# Altium footprint library PcbLib_ICs.PcbLib: 317 footprints (part 13 of 24) (continued)
## QFN32 [mm] "QFN, 32-Leads, Body 5.00x5.00mm, Pitch 0.50mm, Thermal Pad 3.50x3.50mm, IPC Medium Density"
height 1.12
pads (33):
  rect 0.9x0.3 smd paste+0 mask+0.05: 1(-2.6,1.75)
  oval 0.9x0.3 smd paste+0 mask+0.05: 2(-2.6,1.25) 3(-2.6,0.75) 4(-2.6,0.25) 5(-2.6,-0.25) 6(-2.6,-0.75) 7(-2.6,-1.25) 8(-2.6,-1.75) 17(2.6,-1.75) 18(2.6,-1.25) 19(2.6,-0.75) 20(2.6,-0.25) 21(2.6,0.25) 22(2.6,0.75) 23(2.6,1.25) 24(2.6,1.75)
  oval 0.3x0.9 smd paste+0 mask+0.05: 9(-1.75,-2.6) 10(-1.25,-2.6) 11(-0.75,-2.6) 12(-0.25,-2.6) 13(0.25,-2.6) 14(0.75,-2.6) 15(1.25,-2.6) 16(1.75,-2.6) 25(1.75,2.6) 26(1.25,2.6) 27(0.75,2.6) 28(0.25,2.6) 29(-0.25,2.6) 30(-0.75,2.6) 31(-1.25,2.6) 32(-1.75,2.6)
  rrect10% 3.5x3.5 smd paste-3.5 mask+0.075: EP(0,0)
via 0,0 diameter 0.7 hole 0.3
via -0.6,0.6 diameter 0.7 hole 0.3
via 0.6,0.6 diameter 0.7 hole 0.3
via 0.8,1.4 diameter 0.7 hole 0.3
via 1.4,0.8 diameter 0.7 hole 0.3
via -0.7,1.4 diameter 0.7 hole 0.3
via -1.4,0.9 diameter 0.7 hole 0.3
via 1.4,-0.9 diameter 0.7 hole 0.3
via 0.7,-1.4 diameter 0.7 hole 0.3
via -1.4,-0.8 diameter 0.7 hole 0.3
via -0.8,-1.4 diameter 0.7 hole 0.3
via -0.6,-0.6 diameter 0.7 hole 0.3
via 0.6,-0.6 diameter 0.7 hole 0.3
Top Overlay:
  circle w0.25: c-3.5,2.5 r0.125
  lines w0.2: -2.715,-2.3 -2.715,-2.715 -2.3,-2.715 ; -2.715,2.3 -2.715,2.715 -2.3,2.715 ; 2.3,-2.715 2.715,-2.715 2.715,-2.3 ; 2.3,2.715 2.715,2.715 2.715,2.3
Top Paste:
  rectangle: 0.85,-1.55 1.55,-0.85
  rectangle: 0.05,-1.55 0.75,-0.85
  rectangle: -0.75,-1.55 -0.05,-0.85
  rectangle: -1.55,-1.55 -0.85,-0.85
  rectangle: -1.55,-0.75 -0.85,-0.05
  rectangle: -0.75,-0.75 -0.05,-0.05
  rectangle: 0.05,-0.75 0.75,-0.05
  rectangle: 0.85,-0.75 1.55,-0.05
  rectangle: -1.55,0.05 -0.85,0.75
  rectangle: -0.75,0.05 -0.05,0.75
  rectangle: 0.05,0.05 0.75,0.75
  rectangle: 0.85,0.05 1.55,0.75
  rectangle: -1.55,0.85 -0.85,1.55
  rectangle: -0.75,0.85 -0.05,1.55
  rectangle: 0.05,0.85 0.75,1.55
  rectangle: 0.85,0.85 1.55,1.55
Bottom Solder:
  region: -1.9,1.9 -0.5,1.9 0,1.4 0.5,1.9 1.9,1.9 1.9,0.5 1.4,0 1.9,-0.5 1.9,-1.9 0.5,-1.9 0,-1.4 -0.5,-1.9 -1.9,-1.9 -1.9,-0.5 -1.4,0 -1.9,0.5
Top Assy:
  circle w0.05: c-2,2 r0.2
  lines w0.05: -2.577,-1.9 -2.61,-1.9 -2.61,-1.6 -2.577,-1.6 ; -2.577,-1.4 -2.61,-1.4 -2.61,-1.1 -2.577,-1.1 ; -2.577,-0.9 -2.61,-0.9 -2.61,-0.6 -2.577,-0.6 ; -2.577,-0.4 -2.61,-0.4 -2.61,-0.1 -2.577,-0.1 ; -2.577,0.1 -2.61,0.1 -2.61,0.4 -2.577,0.4 ; -2.577,0.6 -2.61,0.6 -2.61,0.9 -2.577,0.9 ; -2.577,1.1 -2.61,1.1 -2.61,1.4 -2.577,1.4 ; -2.577,1.6 -2.61,1.6 -2.61,1.9 -2.577,1.9 ; -1.9,-2.577 -1.9,-2.61 -1.6,-2.61 -1.6,-2.577 ; -1.9,2.577 -1.9,2.61 -1.6,2.61 -1.6,2.577 ; -1.4,-2.577 -1.4,-2.61 -1.1,-2.61 -1.1,-2.577 ; -1.4,2.577 -1.4,2.61 -1.1,2.61 -1.1,2.577 ; -0.9,-2.577 -0.9,-2.61 -0.6,-2.61 -0.6,-2.577 ; -0.9,2.577 -0.9,2.61 -0.6,2.61 -0.6,2.577 ; -0.4,-2.577 -0.4,-2.61 -0.1,-2.61 -0.1,-2.577 ; -0.4,2.577 -0.4,2.61 -0.1,2.61 -0.1,2.577 ; 0.1,-2.577 0.1,-2.61 0.4,-2.61 0.4,-2.577 ; 0.1,2.577 0.1,2.61 0.4,2.61 0.4,2.577 ; 0.6,-2.577 0.6,-2.61 0.9,-2.61 0.9,-2.577 ; 0.6,2.577 0.6,2.61 0.9,2.61 0.9,2.577 ; 1.1,-2.577 1.1,-2.61 1.4,-2.61 1.4,-2.577 ; 1.1,2.577 1.1,2.61 1.4,2.61 1.4,2.577 ; 1.6,-2.577 1.6,-2.61 1.9,-2.61 1.9,-2.577 ; 1.6,2.577 1.6,2.61 1.9,2.61 1.9,2.577 ; 2.577,-1.9 2.61,-1.9 2.61,-1.6 2.577,-1.6 ; 2.577,-1.4 2.61,-1.4 2.61,-1.1 2.577,-1.1 ; 2.577,-0.9 2.61,-0.9 2.61,-0.6 2.577,-0.6 ; 2.577,-0.4 2.61,-0.4 2.61,-0.1 2.577,-0.1 ; 2.577,0.1 2.61,0.1 2.61,0.4 2.577,0.4 ; 2.577,0.6 2.61,0.6 2.61,0.9 2.577,0.9 ; 2.577,1.1 2.61,1.1 2.61,1.4 2.577,1.4 ; 2.577,1.6 2.61,1.6 2.61,1.9 2.577,1.9 ; -2.565,-2.565 -2.565,2.565 2.565,2.565 2.565,-2.565 -2.565,-2.565
  text ".Designator" at -3.443,-0.467 h2
Top Text:
  lines w0.05: -3.15,-3.15 3.15,-3.15 3.15,3.15 -3.15,3.15 -3.15,-3.15
  lines w0.1: -0.5,0 0.5,0 ; 0,-0.5 0,0.5
3D body "User Library-qfn32-5x5.STEP": height 0.8, standoff 0, extent -2.52,-2.51 2.5,2.51

## QFN32-0.4 [mm] "QFN, 32-Leads, Body 4,00x4,00mm, Pitch 0,40mm, Thermal Pad 2,80x2,80mm, IPC Medium Density"
height 1
pads (33):
  rect 0.55x0.2 smd paste+0 mask+0.05: 1(-1.925,1.4)
  rrect50% 0.55x0.2 smd paste+0 mask+0.05: 2(-1.925,1) 3(-1.925,0.6) 4(-1.925,0.2) 5(-1.925,-0.2) 6(-1.925,-0.6) 7(-1.925,-1) 8(-1.925,-1.4) 17(1.925,-1.4) 18(1.925,-1) 19(1.925,-0.6) 20(1.925,-0.2) 21(1.925,0.2) 22(1.925,0.6) 23(1.925,1) 24(1.925,1.4)
  rrect50% 0.2x0.55 smd paste+0 mask+0.05: 9(-1.4,-1.925) 10(-1,-1.925) 11(-0.6,-1.925) 12(-0.2,-1.925) 13(0.2,-1.925) 14(0.6,-1.925) 15(1,-1.925) 16(1.4,-1.925) 25(1.4,1.925) 26(1,1.925) 27(0.6,1.925) 28(0.2,1.925) 29(-0.2,1.925) 30(-0.6,1.925) 31(-1,1.925) 32(-1.4,1.925)
  rrect10% 2.8x2.8 smd paste-3 mask+0.05: EP(0,0)
via -0.5,-1.1 diameter 0.5 hole 0.2
via -1.1,-0.5 diameter 0.5 hole 0.2
via -0.5,-0.5 diameter 0.5 hole 0.2
via 0.5,-1.1 diameter 0.5 hole 0.2
via 1.1,-0.5 diameter 0.5 hole 0.2
via 0.5,-0.5 diameter 0.5 hole 0.2
via 0.5,1.1 diameter 0.5 hole 0.2
via 1.1,0.5 diameter 0.5 hole 0.2
via 0.5,0.5 diameter 0.5 hole 0.2
via -0.5,1.1 diameter 0.5 hole 0.2
via -1.1,0.5 diameter 0.5 hole 0.2
via 0,0 diameter 0.5 hole 0.2
via -0.5,0.5 diameter 0.5 hole 0.2
Top Overlay:
  circle w0.25: c-2.9,2.1 r0.125
  lines w0.2: -2.2,-1.785 -2.2,-2.2 -1.785,-2.2 ; -2.2,1.785 -2.2,2.2 -1.785,2.2 ; 1.785,-2.2 2.2,-2.2 2.2,-1.785 ; 1.785,2.2 2.2,2.2 2.2,1.785
Top Paste:
  rectangle: -0.55,-0.55 -0.05,-0.05
  region: 0.55,-0.55 0.55,-0.05 0.05,-0.05 0.05,-0.55
  region: 0.55,0.55 0.05,0.55 0.05,0.05 0.55,0.05
  region: -0.55,0.55 -0.55,0.05 -0.05,0.05 -0.05,0.55
  region: 1.15,1.15 0.65,1.15 0.65,0.65 1.15,0.65
  region: 1.15,0.55 0.65,0.55 0.65,0.05 1.15,0.05
  region: -0.55,1.15 -0.55,0.65 -0.05,0.65 -0.05,1.15
  region: 0.05,1.15 0.05,0.65 0.55,0.65 0.55,1.15
  region: 1.15,-0.55 1.15,-0.05 0.65,-0.05 0.65,-0.55
  region: 0.55,-1.15 0.55,-0.65 0.05,-0.65 0.05,-1.15
  region: 1.15,-1.15 1.15,-0.65 0.65,-0.65 0.65,-1.15
  region: -1.15,1.15 -1.15,0.65 -0.65,0.65 -0.65,1.15
  region: -1.15,0.55 -1.15,0.05 -0.65,0.05 -0.65,0.55
  rectangle: -1.15,-0.55 -0.65,-0.05
  rectangle: -1.15,-1.15 -0.65,-0.65
  region: -0.05,-1.15 -0.05,-0.65 -0.55,-0.65 -0.55,-1.15
Bottom Solder:
  region: -1.5,1.5 -0.3,1.5 0,1.2 0.3,1.5 1.5,1.5 1.5,0.3 1.2,0 1.5,-0.3 1.5,-1.5 0.3,-1.5 0,-1.2 -0.3,-1.5 -1.5,-1.5 -1.5,-0.3 -1.199,0.001 -1.5,0.301
Top Assy:
  circle w0.05: c-1.485,1.485 r0.2
  lines w0.05: -2.067,-1.55 -2.1,-1.55 -2.1,-1.25 -2.067,-1.25 ; -2.067,-1.15 -2.1,-1.15 -2.1,-0.85 -2.067,-0.85 ; -2.067,-0.75 -2.1,-0.75 -2.1,-0.45 -2.067,-0.45 ; -2.067,-0.35 -2.1,-0.35 -2.1,-0.05 -2.067,-0.05 ; -2.067,0.05 -2.1,0.05 -2.1,0.35 -2.067,0.35 ; -2.067,0.45 -2.1,0.45 -2.1,0.75 -2.067,0.75 ; -2.067,0.85 -2.1,0.85 -2.1,1.15 -2.067,1.15 ; -2.067,1.25 -2.1,1.25 -2.1,1.55 -2.067,1.55 ; -1.55,-2.067 -1.55,-2.1 -1.25,-2.1 -1.25,-2.067 ; -1.55,2.067 -1.55,2.1 -1.25,2.1 -1.25,2.067 ; -1.15,-2.067 -1.15,-2.1 -0.85,-2.1 -0.85,-2.067 ; -1.15,2.067 -1.15,2.1 -0.85,2.1 -0.85,2.067 ; -0.75,-2.067 -0.75,-2.1 -0.45,-2.1 -0.45,-2.067 ; -0.75,2.067 -0.75,2.1 -0.45,2.1 -0.45,2.067 ; -0.35,-2.067 -0.35,-2.1 -0.05,-2.1 -0.05,-2.067 ; -0.35,2.067 -0.35,2.1 -0.05,2.1 -0.05,2.067 ; 0.05,-2.067 0.05,-2.1 0.35,-2.1 0.35,-2.067 ; 0.05,2.067 0.05,2.1 0.35,2.1 0.35,2.067 ; 0.45,-2.067 0.45,-2.1 0.75,-2.1 0.75,-2.067 ; 0.45,2.067 0.45,2.1 0.75,2.1 0.75,2.067 ; 0.85,-2.067 0.85,-2.1 1.15,-2.1 1.15,-2.067 ; 0.85,2.067 0.85,2.1 1.15,2.1 1.15,2.067 ; 1.25,-2.067 1.25,-2.1 1.55,-2.1 1.55,-2.067 ; 1.25,2.067 1.25,2.1 1.55,2.1 1.55,2.067 ; 2.067,-1.55 2.1,-1.55 2.1,-1.25 2.067,-1.25 ; 2.067,-1.15 2.1,-1.15 2.1,-0.85 2.067,-0.85 ; 2.067,-0.75 2.1,-0.75 2.1,-0.45 2.067,-0.45 ; 2.067,-0.35 2.1,-0.35 2.1,-0.05 2.067,-0.05 ; 2.067,0.05 2.1,0.05 2.1,0.35 2.067,0.35 ; 2.067,0.45 2.1,0.45 2.1,0.75 2.067,0.75 ; 2.067,0.85 2.1,0.85 2.1,1.15 2.067,1.15 ; 2.067,1.25 2.1,1.25 2.1,1.55 2.067,1.55 ; -2.05,-2.05 -2.05,2.05 2.05,2.05 2.05,-2.05 -2.05,-2.05
  text ".Designator" at -3.443,-0.467 h2
Top Text:
  lines w0.05: -2.4,-2.4 -2.4,2.4 2.4,2.4 2.4,-2.4 -2.4,-2.4
  lines w0.1: -0.5,0 0.5,0 ; 0,-0.5 0,0.5
3D body "QFN32-0.4.STEP": height 1, standoff 0, extent -2.005,-2.005 2.005,2.005

## QFN32_IP2716 [mm] "QFN, 32-Leads, Body 5.00x5.00mm, Pitch 0.50mm, Thermal Pad 3.50x3.50mm, IPC Medium Density"
height 1.12
pads (33):
  rect 0.9x0.3 smd paste+0 mask+0.05: 1(-2.55,1.75)
  oval 0.9x0.3 smd paste+0 mask+0.05: 2(-2.55,1.25) 3(-2.55,0.75) 4(-2.55,0.25) 5(-2.55,-0.25) 6(-2.55,-0.75) 7(-2.55,-1.25) 8(-2.55,-1.75) 17(2.55,-1.75) 18(2.55,-1.25) 19(2.55,-0.75) 20(2.55,-0.25) 21(2.55,0.25) 22(2.55,0.75) 23(2.55,1.25) 24(2.55,1.75)
  oval 0.3x0.9 smd paste+0 mask+0.05: 9(-1.75,-2.55) 10(-1.25,-2.55) 11(-0.75,-2.55) 12(-0.25,-2.55) 13(0.25,-2.55) 14(0.75,-2.55) 15(1.25,-2.55) 16(1.75,-2.55) 25(1.75,2.55) 26(1.25,2.55) 27(0.75,2.55) 28(0.25,2.55) 29(-0.25,2.55) 30(-0.75,2.55) 31(-1.25,2.55) 32(-1.75,2.55)
  rrect10% 3.5x3.5 smd paste-3.5 mask+0.075: EP(0,0)
via 1.1,1.1 diameter 0.7 hole 0.3
via 1.1,0 diameter 0.7 hole 0.3
via 1.1,-1.1 diameter 0.7 hole 0.3
via 0,-1.1 diameter 0.7 hole 0.3
via -1.1,-1.1 diameter 0.7 hole 0.3
via -1.1,0 diameter 0.7 hole 0.3
via -1.1,1.1 diameter 0.7 hole 0.3
via 0,1.1 diameter 0.7 hole 0.3
via 0,0 diameter 0.7 hole 0.3
Top Overlay:
  circle w0.25: c-3.5,2.5 r0.125
  lines w0.2: -2.715,-2.3 -2.715,-2.715 -2.3,-2.715 ; -2.715,2.3 -2.715,2.715 -2.3,2.715 ; 2.3,-2.715 2.715,-2.715 2.715,-2.3 ; 2.3,2.715 2.715,2.715 2.715,2.3
Top Paste:
  rectangle: 0.85,0.85 1.55,1.55
  rectangle: 0.05,0.85 0.75,1.55
  rectangle: -0.75,0.85 -0.05,1.55
  rectangle: -1.55,0.85 -0.85,1.55
  rectangle: 0.85,0.05 1.55,0.75
  rectangle: 0.05,0.05 0.75,0.75
  rectangle: -0.75,0.05 -0.05,0.75
  rectangle: -1.55,0.05 -0.85,0.75
  rectangle: 0.85,-0.75 1.55,-0.05
  rectangle: 0.05,-0.75 0.75,-0.05
  rectangle: -0.75,-0.75 -0.05,-0.05
  rectangle: -1.55,-0.75 -0.85,-0.05
  rectangle: -1.55,-1.55 -0.85,-0.85
  rectangle: -0.75,-1.55 -0.05,-0.85
  rectangle: 0.05,-1.55 0.75,-0.85
  rectangle: 0.85,-1.55 1.55,-0.85
Bottom Solder:
  region: -1.9,1.9 -0.3,1.9 0,1.6 0.3,1.9 1.9,1.9 1.9,0.3 1.6,0 1.9,-0.3 1.9,-1.9 0.3,-1.9 0,-1.6 -0.3,-1.9 -1.9,-1.9 -1.9,-0.3 -1.6,0 -1.9,0.3
Top Assy:
  circle w0.05: c-2,2 r0.2
  lines w0.05: -2.577,-1.9 -2.61,-1.9 -2.61,-1.6 -2.577,-1.6 ; -2.577,-1.4 -2.61,-1.4 -2.61,-1.1 -2.577,-1.1 ; -2.577,-0.9 -2.61,-0.9 -2.61,-0.6 -2.577,-0.6 ; -2.577,-0.4 -2.61,-0.4 -2.61,-0.1 -2.577,-0.1 ; -2.577,0.1 -2.61,0.1 -2.61,0.4 -2.577,0.4 ; -2.577,0.6 -2.61,0.6 -2.61,0.9 -2.577,0.9 ; -2.577,1.1 -2.61,1.1 -2.61,1.4 -2.577,1.4 ; -2.577,1.6 -2.61,1.6 -2.61,1.9 -2.577,1.9 ; -1.9,-2.577 -1.9,-2.61 -1.6,-2.61 -1.6,-2.577 ; -1.9,2.577 -1.9,2.61 -1.6,2.61 -1.6,2.577 ; -1.4,-2.577 -1.4,-2.61 -1.1,-2.61 -1.1,-2.577 ; -1.4,2.577 -1.4,2.61 -1.1,2.61 -1.1,2.577 ; -0.9,-2.577 -0.9,-2.61 -0.6,-2.61 -0.6,-2.577 ; -0.9,2.577 -0.9,2.61 -0.6,2.61 -0.6,2.577 ; -0.4,-2.577 -0.4,-2.61 -0.1,-2.61 -0.1,-2.577 ; -0.4,2.577 -0.4,2.61 -0.1,2.61 -0.1,2.577 ; 0.1,-2.577 0.1,-2.61 0.4,-2.61 0.4,-2.577 ; 0.1,2.577 0.1,2.61 0.4,2.61 0.4,2.577 ; 0.6,-2.577 0.6,-2.61 0.9,-2.61 0.9,-2.577 ; 0.6,2.577 0.6,2.61 0.9,2.61 0.9,2.577 ; 1.1,-2.577 1.1,-2.61 1.4,-2.61 1.4,-2.577 ; 1.1,2.577 1.1,2.61 1.4,2.61 1.4,2.577 ; 1.6,-2.577 1.6,-2.61 1.9,-2.61 1.9,-2.577 ; 1.6,2.577 1.6,2.61 1.9,2.61 1.9,2.577 ; 2.577,-1.9 2.61,-1.9 2.61,-1.6 2.577,-1.6 ; 2.577,-1.4 2.61,-1.4 2.61,-1.1 2.577,-1.1 ; 2.577,-0.9 2.61,-0.9 2.61,-0.6 2.577,-0.6 ; 2.577,-0.4 2.61,-0.4 2.61,-0.1 2.577,-0.1 ; 2.577,0.1 2.61,0.1 2.61,0.4 2.577,0.4 ; 2.577,0.6 2.61,0.6 2.61,0.9 2.577,0.9 ; 2.577,1.1 2.61,1.1 2.61,1.4 2.577,1.4 ; 2.577,1.6 2.61,1.6 2.61,1.9 2.577,1.9 ; -2.565,-2.565 2.565,-2.565 2.565,2.565 -2.565,2.565 -2.565,-2.565
  text ".Designator" at -3.443,-0.467 h2
Top Text:
  lines w0.05: -3.15,-3.15 -3.15,3.15 3.15,3.15 3.15,-3.15 -3.15,-3.15
  lines w0.1: -0.5,0 0.5,0 ; 0,-0.5 0,0.5
3D body "QFN32_IP2716.STEP": height 0.85, standoff 0, extent -2.525,-2.525 2.525,2.525

## QFN32_SGTL5000 [mm]
pads (33):
  rect 0.75x0.25 smd paste+0 mask+0.08: 1(-2.375,1.75)
  oval 0.75x0.25 smd paste+0 mask+0.08: 2(-2.375,1.25) 3(-2.375,0.75) 4(-2.375,0.25) 5(-2.375,-0.25) 6(-2.375,-0.75) 7(-2.375,-1.25) 8(-2.375,-1.75) 17(2.375,-1.75) 18(2.375,-1.25) 19(2.375,-0.75) 20(2.375,-0.25) 21(2.375,0.25) 22(2.375,0.75) 23(2.375,1.25) 24(2.375,1.75)
  oval 0.25x0.75 smd paste+0 mask+0.08: 9(-1.75,-2.375) 10(-1.25,-2.375) 11(-0.75,-2.375) 12(-0.25,-2.375) 13(0.25,-2.375) 14(0.75,-2.375) 15(1.25,-2.375) 16(1.75,-2.375) 25(1.75,2.375) 26(1.25,2.375) 27(0.75,2.375) 28(0.25,2.375) 29(-0.25,2.375) 30(-0.75,2.375) 31(-1.25,2.375) 32(-1.75,2.375)
  rrect30% 3.65x3.65 smd paste-10 mask+0.08: EP(0,0)
via 0.6,-0.6 diameter 0.7 hole 0.3
via -0.6,-0.6 diameter 0.7 hole 0.3
via -0.8,-1.4 diameter 0.7 hole 0.3
via -1.4,-0.8 diameter 0.7 hole 0.3
via 0.7,-1.4 diameter 0.7 hole 0.3
via 1.4,-0.9 diameter 0.7 hole 0.3
via -1.4,0.9 diameter 0.7 hole 0.3
via -0.7,1.4 diameter 0.7 hole 0.3
via 1.4,0.8 diameter 0.7 hole 0.3
via 0.8,1.4 diameter 0.7 hole 0.3
via 0.6,0.6 diameter 0.7 hole 0.3
via -0.6,0.6 diameter 0.7 hole 0.3
via 0,0 diameter 0.7 hole 0.3
Top Overlay:
  circle w0.25: c-3.35,2.55 r0.125
  lines w0.2: -2.7,2.275 -2.275,2.7 ; -2.275,-2.7 -2.7,-2.275 ; 2.275,-2.7 2.7,-2.275 ; 2.7,2.275 2.275,2.7 ; -2.7,-2.275 -2.7,-2.275 ; 2.275,2.7 2.275,2.7
Top Paste:
  rectangle: 0.1,-0.7 0.7,-0.1
  rectangle: -0.7,-0.7 -0.1,-0.1
  rectangle: -1.5,-0.7 -0.9,-0.1
  rectangle: 0.1,0.9 0.7,1.5
  rectangle: 0.1,0.1 0.7,0.7
  rectangle: -1.5,0.9 -0.9,1.5
  rectangle: -0.7,0.1 -0.1,0.7
  rectangle: -1.5,0.1 -0.9,0.7
  region: -0.1,1.5 -0.7,1.5 -0.7,0.9 -0.1,0.9
  rectangle: 0.9,-0.7 1.5,-0.1
  rectangle: 0.9,0.9 1.5,1.5
  rectangle: 0.9,0.1 1.5,0.7
  rectangle: 0.1,-1.5 0.7,-0.9
  rectangle: -0.7,-1.5 -0.1,-0.9
  rectangle: -1.5,-1.5 -0.9,-0.9
  rectangle: 0.9,-1.5 1.5,-0.9
Bottom Solder:
  region: -1.9,1.9 -0.6,1.9 0,1.4 0.6,1.9 1.9,1.9 1.9,0.6 1.4,0 1.9,-0.6 1.9,-1.9 0.6,-1.9 0,-1.4 -0.6,-1.9 -1.9,-1.9 -1.9,-0.6 -1.4,0 -1.9,0.6
Top Assy:
  drawing of 225 lines, arcs and shapes, not listed
  text ".Designator" at -3.443,-0.467 h2
Top Text:
  lines w0.05: -2.85,-2.85 2.85,-2.85 2.85,2.85 -2.85,2.85 -2.85,-2.85
  lines w0.1: -0.5,0 0.5,0 ; 0,-0.5 0,0.5
3D body "User Library-LFCSP-32.step": height 0.89, standoff -0.04, extent -2.5,-2.495 2.52,2.525

## QFN38(LINEAR) [mm] "QFN-38 package 5x7 mm from Linear Technology devices"
height 0.75
pads (39):
  oval 0.9x0.25 smd paste+0 mask+0.05: 1(-2.4,2.75) 2(-2.4,2.25) 3(-2.4,1.75) 4(-2.4,1.25) 5(-2.4,0.75) 6(-2.4,0.25) 7(-2.4,-0.25) 8(-2.4,-0.75) 9(-2.4,-1.25) 10(-2.4,-1.75) 11(-2.4,-2.25) 12(-2.4,-2.75) 20(2.4,-2.75) 21(2.4,-2.25) 22(2.4,-1.75) 23(2.4,-1.25) 24(2.4,-0.75) 25(2.4,-0.25) 26(2.4,0.25) 27(2.4,0.75) 28(2.4,1.25) 29(2.4,1.75) 30(2.4,2.25) 31(2.4,2.75)
  oval 0.25x0.9 smd paste+0 mask+0.05: 13(-1.5,-3.4) 14(-1,-3.4) 15(-0.5,-3.4) 16(0,-3.4) 17(0.5,-3.4) 18(1,-3.4) 19(1.5,-3.4) 32(1.5,3.4) 33(1,3.4) 34(0.5,3.4) 35(0,3.4) 36(-0.5,3.4) 37(-1,3.4) 38(-1.5,3.4)
  rrect10% 3.05x5.55 smd paste-50 mask+0.05: EP(0,0)
Top Overlay:
  circle w0.25: c-3.35,3.55 r0.125
  lines w0.2: -2.7,-3.275 -2.7,-3.7 -2.025,-3.7 ; -2.7,3.275 -2.7,3.7 -2.025,3.7 ; 2.025,-3.7 2.7,-3.7 2.7,-3.275 ; 2.025,3.7 2.7,3.7 2.7,3.275
Top Paste:
  region: -1.55,2.7 -1.55,2.2 -1.15,2.2 -1.15,2.7
  region: -0.95,2.7 -0.95,2.2 -0.45,2.2 -0.45,2.7
  region: 1.15,2.7 1.15,2.2 1.55,2.2 1.55,2.7
  region: 0.45,2.7 0.45,2.2 0.95,2.2 0.95,2.7
  region: -0.25,2.7 -0.25,2.2 0.25,2.2 0.25,2.7
  region: -1.55,2 -1.55,1.5 -1.15,1.5 -1.15,2
  region: -0.95,2 -0.95,1.5 -0.45,1.5 -0.45,2
  region: 1.15,2 1.15,1.5 1.55,1.5 1.55,2
  region: 0.45,2 0.45,1.5 0.95,1.5 0.95,2
  region: -0.25,2 -0.25,1.5 0.25,1.5 0.25,2
  region: 1.55,-2.7 1.55,-2.2 1.15,-2.2 1.15,-2.7
  region: 0.95,-2.7 0.95,-2.2 0.45,-2.2 0.45,-2.7
  region: -1.15,-2.7 -1.15,-2.2 -1.55,-2.2 -1.55,-2.7
  region: -0.45,-2.7 -0.45,-2.2 -0.95,-2.2 -0.95,-2.7
  region: 0.25,-2.7 0.25,-2.2 -0.25,-2.2 -0.25,-2.7
  region: 1.55,-2 1.55,-1.5 1.15,-1.5 1.15,-2
  region: 0.95,-2 0.95,-1.5 0.45,-1.5 0.45,-2
  region: -1.15,-2 -1.15,-1.5 -1.55,-1.5 -1.55,-2
  region: -0.45,-2 -0.45,-1.5 -0.95,-1.5 -0.95,-2
  region: 0.25,-2 0.25,-1.5 -0.25,-1.5 -0.25,-2
  region: 1.15,1.3 1.15,0.8 1.55,0.8 1.55,1.3
  region: 1.55,-1.3 1.55,-0.8 1.15,-0.8 1.15,-1.3
  region: 1.15,0.6 1.15,0.1 1.55,0.1 1.55,0.6
  region: 1.15,-0.1 1.15,-0.6 1.55,-0.6 1.55,-0.1
  region: 0.45,1.3 0.45,0.8 0.95,0.8 0.95,1.3
  region: 0.95,-1.3 0.95,-0.8 0.45,-0.8 0.45,-1.3
  region: 0.45,0.6 0.45,0.1 0.95,0.1 0.95,0.6
  region: 0.45,-0.1 0.45,-0.6 0.95,-0.6 0.95,-0.1
  region: -1.15,-1.3 -1.15,-0.8 -1.55,-0.8 -1.55,-1.3
  region: -1.55,1.3 -1.55,0.8 -1.15,0.8 -1.15,1.3
  region: -1.15,-0.6 -1.15,-0.1 -1.55,-0.1 -1.55,-0.6
  region: -1.15,0.1 -1.15,0.6 -1.55,0.6 -1.55,0.1
  region: -0.45,-1.3 -0.45,-0.8 -0.95,-0.8 -0.95,-1.3
  region: -0.95,1.3 -0.95,0.8 -0.45,0.8 -0.45,1.3
  region: -0.45,-0.6 -0.45,-0.1 -0.95,-0.1 -0.95,-0.6
  region: -0.45,0.1 -0.45,0.6 -0.95,0.6 -0.95,0.1
  region: -0.25,1.3 -0.25,0.8 0.25,0.8 0.25,1.3
  region: 0.25,-1.3 0.25,-0.8 -0.25,-0.8 -0.25,-1.3
  region: -0.25,0.6 -0.25,0.1 0.25,0.1 0.25,0.6
  region: -0.25,-0.1 -0.25,-0.6 0.25,-0.6 0.25,-0.1
Top Assy:
  circle w0.05: c-2,3 r0.2
  lines w0.05: -2.557,-2.9 -2.59,-2.9 -2.59,-2.6 -2.557,-2.6 ; -2.557,-2.4 -2.59,-2.4 -2.59,-2.1 -2.557,-2.1 ; -2.557,-1.9 -2.59,-1.9 -2.59,-1.6 -2.557,-1.6 ; -2.557,-1.4 -2.59,-1.4 -2.59,-1.1 -2.557,-1.1 ; -2.557,-0.9 -2.59,-0.9 -2.59,-0.6 -2.557,-0.6 ; -2.557,-0.4 -2.59,-0.4 -2.59,-0.1 -2.557,-0.1 ; -2.557,0.1 -2.59,0.1 -2.59,0.4 -2.557,0.4 ; -2.557,0.6 -2.59,0.6 -2.59,0.9 -2.557,0.9 ; -2.557,1.1 -2.59,1.1 -2.59,1.4 -2.557,1.4 ; -2.557,1.6 -2.59,1.6 -2.59,1.9 -2.557,1.9 ; -2.557,2.1 -2.59,2.1 -2.59,2.4 -2.557,2.4 ; -2.557,2.6 -2.59,2.6 -2.59,2.9 -2.557,2.9 ; -1.65,-3.557 -1.65,-3.59 -1.35,-3.59 -1.35,-3.557 ; -1.65,3.557 -1.65,3.59 -1.35,3.59 -1.35,3.557 ; -1.15,-3.557 -1.15,-3.59 -0.85,-3.59 -0.85,-3.557 ; -1.15,3.557 -1.15,3.59 -0.85,3.59 -0.85,3.557 ; -0.65,-3.557 -0.65,-3.59 -0.35,-3.59 -0.35,-3.557 ; -0.65,3.557 -0.65,3.59 -0.35,3.59 -0.35,3.557 ; -0.15,-3.557 -0.15,-3.59 0.15,-3.59 0.15,-3.557 ; -0.15,3.557 -0.15,3.59 0.15,3.59 0.15,3.557 ; 0.35,-3.557 0.35,-3.59 0.65,-3.59 0.65,-3.557 ; 0.35,3.557 0.35,3.59 0.65,3.59 0.65,3.557 ; 0.85,-3.557 0.85,-3.59 1.15,-3.59 1.15,-3.557 ; 0.85,3.557 0.85,3.59 1.15,3.59 1.15,3.557 ; 1.35,-3.557 1.35,-3.59 1.65,-3.59 1.65,-3.557 ; 1.35,3.557 1.35,3.59 1.65,3.59 1.65,3.557 ; 2.557,-2.9 2.59,-2.9 2.59,-2.6 2.557,-2.6 ; 2.557,-2.4 2.59,-2.4 2.59,-2.1 2.557,-2.1 ; 2.557,-1.9 2.59,-1.9 2.59,-1.6 2.557,-1.6 ; 2.557,-1.4 2.59,-1.4 2.59,-1.1 2.557,-1.1 ; 2.557,-0.9 2.59,-0.9 2.59,-0.6 2.557,-0.6 ; 2.557,-0.4 2.59,-0.4 2.59,-0.1 2.557,-0.1 ; 2.557,0.1 2.59,0.1 2.59,0.4 2.557,0.4 ; 2.557,0.6 2.59,0.6 2.59,0.9 2.557,0.9 ; 2.557,1.1 2.59,1.1 2.59,1.4 2.557,1.4 ; 2.557,1.6 2.59,1.6 2.59,1.9 2.557,1.9 ; 2.557,2.1 2.59,2.1 2.59,2.4 2.557,2.4 ; 2.557,2.6 2.59,2.6 2.59,2.9 2.557,2.9 ; -2.55,-3.55 -2.55,3.55 2.55,3.55 2.55,-3.55 -2.55,-3.55
  text ".Designator" at 0.467,-3.443 h2
Top Text:
  lines w0.05: -3.1,-4.1 -3.1,4.1 3.1,4.1 3.1,-4.1 -3.1,-4.1
  lines w0.1: -0.5,0 0.5,0 ; 0,-0.5 0,0.5
3D body "SW3dPS-QFN-38.STEP": height 1.04, standoff -0.09, extent -2.495,-3.5 2.525,3.52

## QFN40 [mm]
pads (41):
  rect 0.9x0.25 smd paste+0 mask+0.075: 1(-3.05,2.25)
  oval 0.9x0.25 smd paste+0 mask+0.075: 2(-3.05,1.75) 3(-3.05,1.25) 4(-3.05,0.75) 5(-3.05,0.25) 6(-3.05,-0.25) 7(-3.05,-0.75) 8(-3.05,-1.25) 9(-3.05,-1.75) 10(-3.05,-2.25) 21(3.05,-2.25) 22(3.05,-1.75) 23(3.05,-1.25) 24(3.05,-0.75) 25(3.05,-0.25) 26(3.05,0.25) 27(3.05,0.75) 28(3.05,1.25) 29(3.05,1.75) 30(3.05,2.25)
  oval 0.25x0.9 smd paste+0 mask+0.075: 11(-2.25,-3.05) 12(-1.75,-3.05) 13(-1.25,-3.05) 14(-0.75,-3.05) 15(-0.25,-3.05) 16(0.25,-3.05) 17(0.75,-3.05) 18(1.25,-3.05) 19(1.75,-3.05) 20(2.25,-3.05) 31(2.25,3.05) 32(1.75,3.05) 33(1.25,3.05) 34(0.75,3.05) 35(0.25,3.05) 36(-0.25,3.05) 37(-0.75,3.05) 38(-1.25,3.05) 39(-1.75,3.05) 40(-2.25,3.05)
  rrect10% 4.2x4.2 smd paste-10 mask+0.102: EP(0,0)
via 0.6,-0.6 diameter 0.7 hole 0.3
via -0.6,-0.6 diameter 0.7 hole 0.3
via -0.8,-1.4 diameter 0.7 hole 0.3
via -1.4,-0.8 diameter 0.7 hole 0.3
via 0.7,-1.4 diameter 0.7 hole 0.3
via 1.4,-0.9 diameter 0.7 hole 0.3
via -1.4,0.9 diameter 0.7 hole 0.3
via -0.7,1.4 diameter 0.7 hole 0.3
via 1.4,0.8 diameter 0.7 hole 0.3
via 0.8,1.4 diameter 0.7 hole 0.3
via 0.6,0.6 diameter 0.7 hole 0.3
via -0.6,0.6 diameter 0.7 hole 0.3
via 0,0 diameter 0.7 hole 0.3
Top Overlay:
  circle w0.25: c-3.875,3 r0.125
  lines w0.2: -3.2,-2.785 -3.2,-3.2 -2.785,-3.2 ; -3.2,2.785 -3.2,3.2 -2.785,3.2 ; 2.785,-3.2 3.2,-3.2 3.2,-2.785 ; 2.785,3.2 3.2,3.2 3.2,2.785
Top Paste:
  rectangle: -1.9,1.35 -1.35,1.9
  rectangle: -1.25,1.35 -0.7,1.9
  rectangle: -0.6,1.35 -0.05,1.9
  rectangle: 0.05,1.35 0.6,1.9
  rectangle: 0.7,1.35 1.25,1.9
  rectangle: 1.35,1.35 1.9,1.9
  rectangle: 1.35,0.7 1.9,1.25
  rectangle: 0.7,0.7 1.25,1.25
  rectangle: 0.05,0.7 0.6,1.25
  rectangle: -0.6,0.7 -0.05,1.25
  rectangle: -1.25,0.7 -0.7,1.25
  rectangle: -1.9,0.7 -1.35,1.25
  rectangle: -1.9,-0.6 -1.35,-0.05
  rectangle: -1.25,-0.6 -0.7,-0.05
  rectangle: -0.6,-0.6 -0.05,-0.05
  rectangle: 0.05,-0.6 0.6,-0.05
  rectangle: 0.7,-0.6 1.25,-0.05
  rectangle: 1.35,-0.6 1.9,-0.05
  rectangle: 1.35,0.05 1.9,0.6
  rectangle: 0.7,0.05 1.25,0.6
  rectangle: 0.05,0.05 0.6,0.6
  rectangle: -0.6,0.05 -0.05,0.6
  rectangle: -1.25,0.05 -0.7,0.6
  rectangle: -1.9,0.05 -1.35,0.6
  rectangle: -1.9,-1.9 -1.35,-1.35
  rectangle: -1.25,-1.9 -0.7,-1.35
  rectangle: -0.6,-1.9 -0.05,-1.35
  rectangle: 0.05,-1.9 0.6,-1.35
  rectangle: 0.7,-1.9 1.25,-1.35
  rectangle: 1.35,-1.9 1.9,-1.35
  rectangle: 1.35,-1.25 1.9,-0.7
  rectangle: 0.7,-1.25 1.25,-0.7
  rectangle: 0.05,-1.25 0.6,-0.7
  rectangle: -0.6,-1.25 -0.05,-0.7
  rectangle: -1.25,-1.25 -0.7,-0.7
  rectangle: -1.9,-1.25 -1.35,-0.7
Bottom Solder:
  region: -2.2,2.2 -0.4,2.2 0,1.8 0.4,2.2 2.2,2.2 2.2,0.4 1.8,0 2.2,-0.4 2.2,-2.2 0.4,-2.2 0,-1.8 -0.4,-2.2 -2.2,-2.2 -2.2,-0.4 -1.8,0 -2.2,0.4
Top Assy:
  circle w0.05: c-2.5,2.5 r0.2
  lines w0.05: -3.087,-2.4 -3.12,-2.4 -3.12,-2.1 -3.087,-2.1 ; -3.087,-1.9 -3.12,-1.9 -3.12,-1.6 -3.087,-1.6 ; -3.087,-1.4 -3.12,-1.4 -3.12,-1.1 -3.087,-1.1 ; -3.087,-0.9 -3.12,-0.9 -3.12,-0.6 -3.087,-0.6 ; -3.087,-0.4 -3.12,-0.4 -3.12,-0.1 -3.087,-0.1 ; -3.087,0.1 -3.12,0.1 -3.12,0.4 -3.087,0.4 ; -3.087,0.6 -3.12,0.6 -3.12,0.9 -3.087,0.9 ; -3.087,1.1 -3.12,1.1 -3.12,1.4 -3.087,1.4 ; -3.087,1.6 -3.12,1.6 -3.12,1.9 -3.087,1.9 ; -3.087,2.1 -3.12,2.1 -3.12,2.4 -3.087,2.4 ; -2.4,-3.087 -2.4,-3.12 -2.1,-3.12 -2.1,-3.087 ; -2.4,3.087 -2.4,3.12 -2.1,3.12 -2.1,3.087 ; -1.9,-3.087 -1.9,-3.12 -1.6,-3.12 -1.6,-3.087 ; -1.9,3.087 -1.9,3.12 -1.6,3.12 -1.6,3.087 ; -1.4,-3.087 -1.4,-3.12 -1.1,-3.12 -1.1,-3.087 ; -1.4,3.087 -1.4,3.12 -1.1,3.12 -1.1,3.087 ; -0.9,-3.087 -0.9,-3.12 -0.6,-3.12 -0.6,-3.087 ; -0.9,3.087 -0.9,3.12 -0.6,3.12 -0.6,3.087 ; -0.4,-3.087 -0.4,-3.12 -0.1,-3.12 -0.1,-3.087 ; -0.4,3.087 -0.4,3.12 -0.1,3.12 -0.1,3.087 ; 0.1,-3.087 0.1,-3.12 0.4,-3.12 0.4,-3.087 ; 0.1,3.087 0.1,3.12 0.4,3.12 0.4,3.087 ; 0.6,-3.087 0.6,-3.12 0.9,-3.12 0.9,-3.087 ; 0.6,3.087 0.6,3.12 0.9,3.12 0.9,3.087 ; 1.1,-3.087 1.1,-3.12 1.4,-3.12 1.4,-3.087 ; 1.1,3.087 1.1,3.12 1.4,3.12 1.4,3.087 ; 1.6,-3.087 1.6,-3.12 1.9,-3.12 1.9,-3.087 ; 1.6,3.087 1.6,3.12 1.9,3.12 1.9,3.087 ; 2.1,-3.087 2.1,-3.12 2.4,-3.12 2.4,-3.087 ; 2.1,3.087 2.1,3.12 2.4,3.12 2.4,3.087 ; 3.087,-2.4 3.12,-2.4 3.12,-2.1 3.087,-2.1 ; 3.087,-1.9 3.12,-1.9 3.12,-1.6 3.087,-1.6 ; 3.087,-1.4 3.12,-1.4 3.12,-1.1 3.087,-1.1 ; 3.087,-0.9 3.12,-0.9 3.12,-0.6 3.087,-0.6 ; 3.087,-0.4 3.12,-0.4 3.12,-0.1 3.087,-0.1 ; 3.087,0.1 3.12,0.1 3.12,0.4 3.087,0.4 ; 3.087,0.6 3.12,0.6 3.12,0.9 3.087,0.9 ; 3.087,1.1 3.12,1.1 3.12,1.4 3.087,1.4 ; 3.087,1.6 3.12,1.6 3.12,1.9 3.087,1.9 ; 3.087,2.1 3.12,2.1 3.12,2.4 3.087,2.4 ; -3.075,-3.075 -3.075,3.075 3.075,3.075 3.075,-3.075 -3.075,-3.075
  text ".Designator" at -3.443,-0.467 h2
Top Text:
  lines w0.1: -0.5,0 0.5,0 ; 0,-0.5 0,0.5
3D body "QFN-40.STEP": height 1.06, standoff 0.01, extent -3.075,-3.075 3.075,3.075